# Altium footprint library MEBot.PcbLib: 161 footprints (part 7 of 11)
Each footprint in its own frame and in the unit in brackets; x right, y up, seen from the top. Pads: shape width x height; smd on the part's side, far side on the other; paste and mask are expansions set on the pad; w line width, h text height; cw(c..) or ccw(c..) is an arc to the next point about the centre after c.
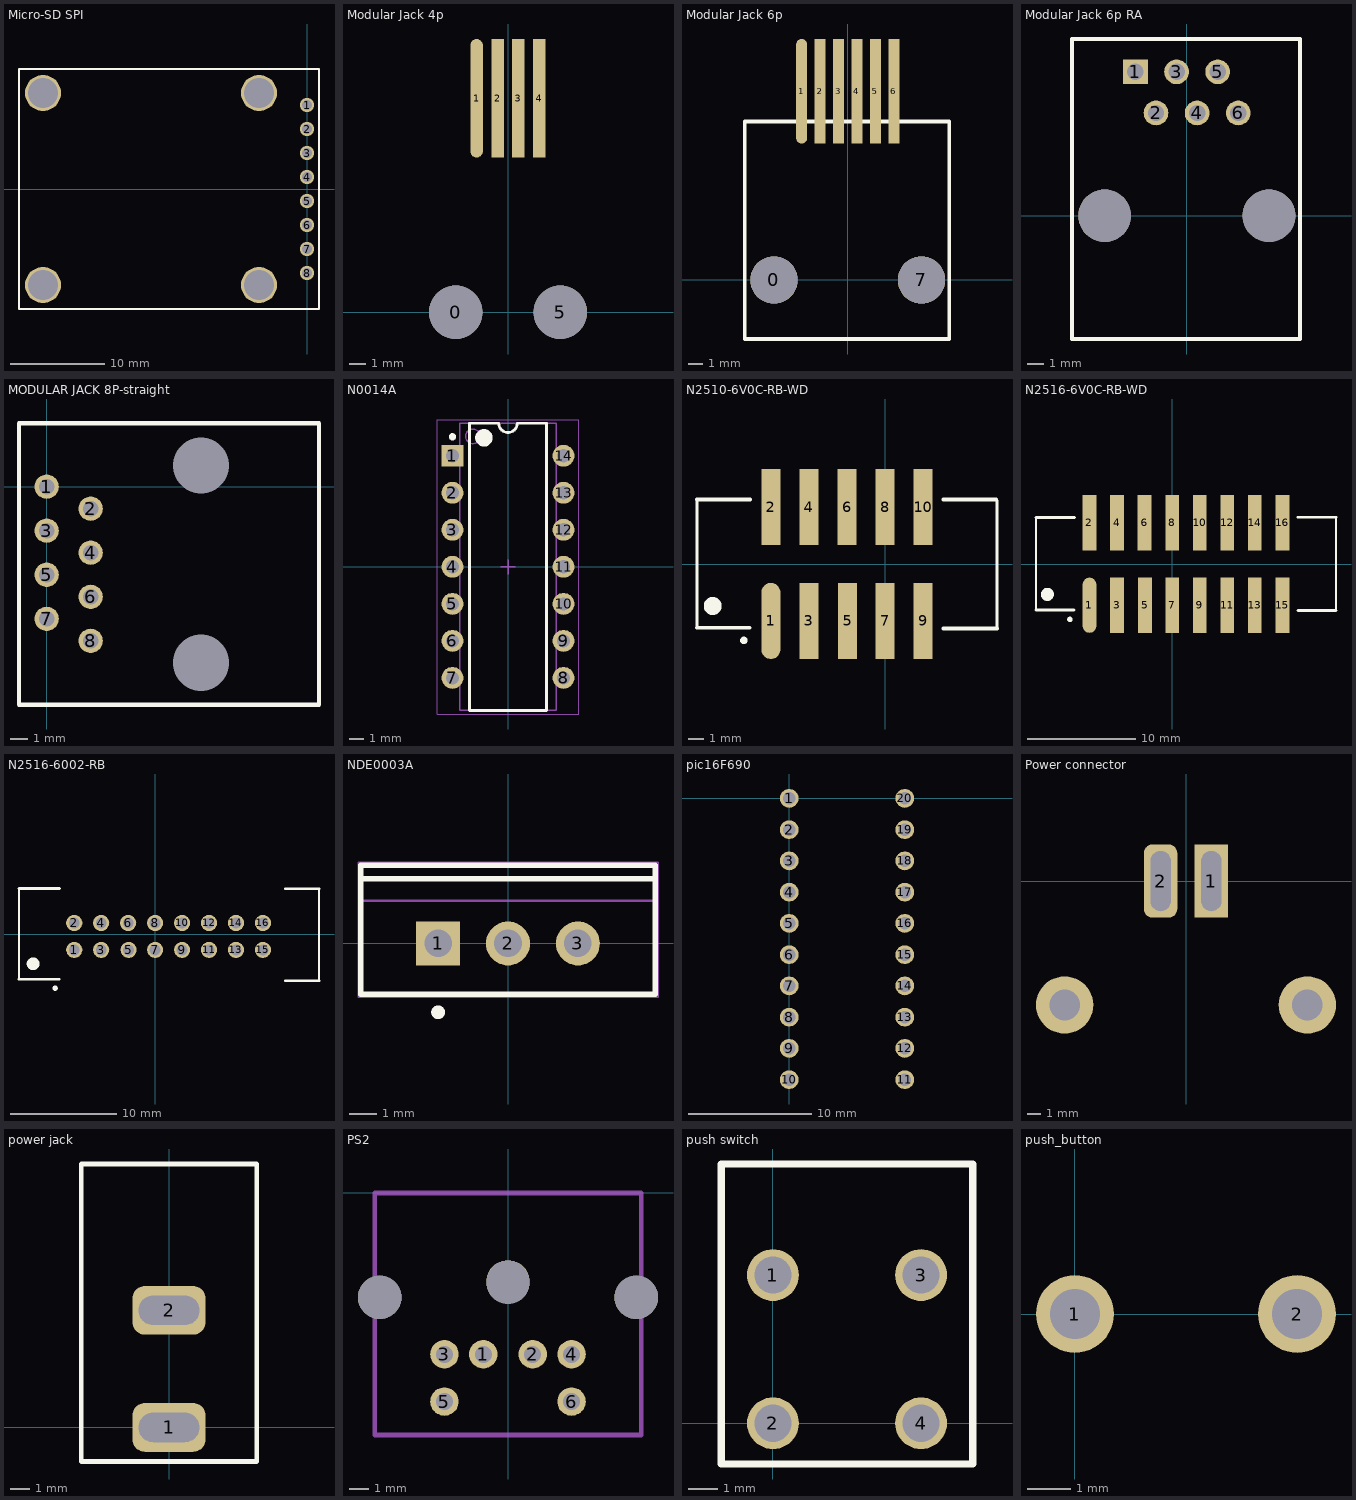
[diagram p6: the footprints below, top view; thin cyan lines are the x and y axes]

## Micro-SD SPI [mil]
pads (12):
  round 60 hole 40: 1(0,350) 2(0,250) 3(0,150) 4(0,50) 5(0,-50) 6(0,-150) 7(0,-250) 8(0,-350)
  round 150 hole 125: ""(-1100,-400) ""(-1100,400) ""(-200,-400) ""(-200,400)
Top Overlay:
  lines w10: -1200,-500 50,-500 50,500 -1200,500 -1200,-500

## Modular Jack 4p [mm] "Modular Ethernet Jack 4P"
pads (6):
  round 3.25 hole 3.25: 0(-3.18,0) 5(3.18,0)
  rrect100% 0.76x7.2 smd: 1(-1.905,13)
  rect 0.76x7.2 smd: 2(-0.635,13) 3(0.635,13) 4(1.905,13)

## Modular Jack 6p [mm] "Modular Ethernet Jack 6P"
height 16
pads (8):
  round 3.25 hole 3.25: 0(-5.08,0) 7(5.08,0)
  rrect100% 0.76x7.2 smd: 1(-3.175,13)
  rect 0.76x7.2 smd: 2(-1.905,13) 3(-0.635,13) 4(0.635,13) 5(1.905,13) 6(3.175,13)
Top Overlay:
  lines w0.254: -7.087,-4.064 -7.087,10.922 6.985,10.922 6.985,-4.064 -7.087,-4.064
3D body "955036671.stp": height 15.72, standoff -2.98, extent -6.63,-4.877 6.58,12.493

## Modular Jack 6p RA [mil] "Modular Ethernet Jack 6P Right Angle"
height 629.92
pads (8):
  rect 60x60 hole 40: 1(-125,350)
  round 60 hole 40: 2(-75,250) 3(-25,350) 4(25,250) 5(75,350) 6(125,250)
  round 127.95 hole 127.95: ""(-200,0) ""(200,0)
Top Overlay:
  lines w10: -279,-300 -279,430 275,430 275,-300 -279,-300
3D body "A-2014-1-4-N-T-R.step": height 644.88, standoff -143.7, extent -264.96,-255.91 264.96,393.7

## MODULAR JACK 8P-straight [mil] "MODULAR JACK 8P straight up"
pads (10):
  round 55 hole 35: 1(0,0) 2(100,-50) 3(0,-100) 4(100,-150) 5(0,-200) 6(100,-250) 7(0,-300) 8(100,-350)
  round 120 hole 127.95 unplated: ""(350.39,-400) ""(350.39,48)
Top Overlay:
  lines w10: -62.74,-495 -62.74,143.8 618.26,143.8 618.26,-495 -62.74,-495
3D body "91139088lf.stp": height 104.56, standoff -655.51, extent -54.93,-489.19 614.75,136.79

## N0014A [mm] "DIP, 14-Leads, Body 19.7x6.6mm, Pitch 2.54mm"
height 5.08
pads (14):
  rect 1.5x1.5 hole 0.9: 1(-3.81,7.62)
  round 1.5 hole 0.9: 2(-3.81,5.08) 3(-3.81,2.54) 4(-3.81,0) 5(-3.81,-2.54) 6(-3.81,-5.08) 7(-3.81,-7.62) 8(3.81,-7.62) 9(3.81,-5.08) 10(3.81,-2.54) 11(3.81,0) 12(3.81,2.54) 13(3.81,5.08) 14(3.81,7.62)
Top Overlay:
  circle w0.25: c-3.81,8.92 r0.125
  circle w0.6: c-1.65,8.85 r0.3
  lines w0.2: -2.65,-9.85 -2.65,9.85 -0.635,9.85 ccw(c0,9.85) 0.635,9.85 2.65,9.85 2.65,-9.85 -2.65,-9.85
Mechanical 1:
  text ".Designator" at -3.048,-0.508 h1.2
Mechanical 13:
  circle w0.1: c-2.4,8.95 r0.5
  lines w0.1: -3.3,-9.85 -3.3,9.85 3.3,9.85 3.3,-9.85 -3.3,-9.85
Mechanical 15:
  lines w0.05: -4.85,-10.1 -4.85,10.1 4.85,10.1 4.85,-10.1 -4.85,-10.1
  lines w0.1: -0.5,0 0.5,0 ; 0,-0.5 0,0.5
3D body: height 5.08, standoff 0.51, extent -3.3,-9.85 3.3,9.85
3D body: height 2.66, standoff 0, extent -3.945,7.12 -3.675,8.12
3D body: height 2.93, standoff 2.66, extent -3.945,7.12 -3.3,8.12
3D body: height 0, standoff -1.6, extent -3.945,7.26 -3.675,7.98
3D body: height 2.66, standoff 0, extent -3.945,4.58 -3.675,5.58
3D body: height 2.93, standoff 2.66, extent -3.945,4.58 -3.3,5.58
3D body: height 0, standoff -1.6, extent -3.945,4.72 -3.675,5.44
3D body: height 2.66, standoff 0, extent -3.945,2.04 -3.675,3.04
3D body: height 2.93, standoff 2.66, extent -3.945,2.04 -3.3,3.04
3D body: height 0, standoff -1.6, extent -3.945,2.18 -3.675,2.9
3D body: height 2.66, standoff 0, extent -3.945,-0.5 -3.675,0.5
3D body: height 2.93, standoff 2.66, extent -3.945,-0.5 -3.3,0.5
3D body: height 0, standoff -1.6, extent -3.945,-0.36 -3.675,0.36
3D body: height 2.66, standoff 0, extent -3.945,-3.04 -3.675,-2.04
3D body: height 2.93, standoff 2.66, extent -3.945,-3.04 -3.3,-2.04
3D body: height 0, standoff -1.6, extent -3.945,-2.9 -3.675,-2.18
3D body: height 2.66, standoff 0, extent -3.945,-5.58 -3.675,-4.58
3D body: height 2.93, standoff 2.66, extent -3.945,-5.58 -3.3,-4.58
3D body: height 0, standoff -1.6, extent -3.945,-5.44 -3.675,-4.72
3D body: height 2.66, standoff 0, extent -3.945,-8.12 -3.675,-7.12
3D body: height 2.93, standoff 2.66, extent -3.945,-8.12 -3.3,-7.12
3D body: height 0, standoff -1.6, extent -3.945,-7.98 -3.675,-7.26
3D body: height 2.66, standoff 0, extent 3.675,-8.12 3.945,-7.12
3D body: height 2.93, standoff 2.66, extent 3.3,-8.12 3.945,-7.12
3D body: height 0, standoff -1.6, extent 3.675,-7.98 3.945,-7.26
3D body: height 2.66, standoff 0, extent 3.675,-5.58 3.945,-4.58
3D body: height 2.93, standoff 2.66, extent 3.3,-5.58 3.945,-4.58
3D body: height 0, standoff -1.6, extent 3.675,-5.44 3.945,-4.72
3D body: height 2.66, standoff 0, extent 3.675,-3.04 3.945,-2.04
3D body: height 2.93, standoff 2.66, extent 3.3,-3.04 3.945,-2.04
3D body: height 0, standoff -1.6, extent 3.675,-2.9 3.945,-2.18
3D body: height 2.66, standoff 0, extent 3.675,-0.5 3.945,0.5
3D body: height 2.93, standoff 2.66, extent 3.3,-0.5 3.945,0.5
3D body: height 0, standoff -1.6, extent 3.675,-0.36 3.945,0.36
3D body: height 2.66, standoff 0, extent 3.675,2.04 3.945,3.04
3D body: height 2.93, standoff 2.66, extent 3.3,2.04 3.945,3.04
3D body: height 0, standoff -1.6, extent 3.675,2.18 3.945,2.9
3D body: height 2.66, standoff 0, extent 3.675,4.58 3.945,5.58
3D body: height 2.93, standoff 2.66, extent 3.3,4.58 3.945,5.58
3D body: height 0, standoff -1.6, extent 3.675,4.72 3.945,5.44
3D body: height 2.66, standoff 0, extent 3.675,7.12 3.945,8.12
3D body: height 2.93, standoff 2.66, extent 3.3,7.12 3.945,8.12
3D body: height 0, standoff -1.6, extent 3.675,7.26 3.945,7.98

## N2510-6V0C-RB-WD [mm] "CONN HEADER SMD 10POS 2.54MM"
height 10
pads (10):
  rrect100% 1.27x5.08 smd: 1(-7.62,-3.8)
  rect 1.27x5.08 smd: 2(-7.62,3.8) 3(-5.08,-3.8) 4(-5.08,3.8) 5(-2.5,-3.8) 6(-2.54,3.8) 7(0,-3.8) 8(0,3.8) 9(2.54,-3.8) 10(2.54,3.8)
Top Overlay:
  circle w0.25: c-9.425,-5.1 r0.125
  circle w0.6: c-11.5,-2.8 r0.3
  lines w0.2: -12.55,-4.25 -12.55,4.295 ; 7.405,4.295 7.47,4.23 7.47,-4.295
  lines w0.254: -12.55,-4.25 -9.05,-4.25 ; -12.55,4.295 -9.005,4.295 ; 3.905,-4.295 7.47,-4.295 ; 3.905,4.295 7.405,4.295
3D body "2510-6V0C-XX_STEP.stp": height 10.41, standoff 0.25, extent -12.548,-5.588 7.468,5.588

## N2516-6V0C-RB-WD [mm] "CONN HEADER SMD 16POS 2.54MM"
height 10
pads (16):
  rrect100% 1.27x5.08 smd: 1(-7.62,-3.8)
  rect 1.27x5.08 smd: 2(-7.62,3.8) 3(-5.08,-3.8) 4(-5.08,3.8) 5(-2.5,-3.8) 6(-2.54,3.8) 7(0,-3.8) 8(0,3.8) 9(2.54,-3.8) 10(2.54,3.8) 11(5.08,-3.8) 12(5.08,3.8) 13(7.62,-3.8) 14(7.62,3.8) 15(10.16,-3.8) 16(10.16,3.8)
Top Overlay:
  circle w0.6: c-11.5,-2.8 r0.3
  circle w0.25: c-9.425,-5.1 r0.125
  lines w0.2: -12.55,-4.25 -12.55,4.295 ; 15.09,-4.295 15.09,4.23
  lines w0.254: -12.55,-4.25 -9.05,-4.25 ; -12.55,4.295 -9.005,4.295 ; 11.6,4.3 15.1,4.3 ; 11.605,-4.295 15.09,-4.295
3D body "HEADER16P-SMD.stp": height 10.16, standoff 0, extent -12.497,-5.461 15.138,5.715

## N2516-6002-RB [mil] "Connector Header Through Hole 16 position 0.100\" (2.54mm)"
height 393.7
pads (16):
  round 60 hole 40: 1(-300,-58.86) 2(-300,41.14) 3(-200,-58.86) 4(-200,41.14) 5(-98.43,-58.86) 6(-100,41.14) 7(0,-58.86) 8(0,41.14) 9(100,-58.86) 10(100,41.14) 11(200,-58.86) 12(200,41.14) 13(300,-58.86) 14(300,41.14) 15(400,-58.86) 16(400,41.14)
Top Overlay:
  circle w23.62: c-452.76,-110.24 r11.81
  circle w9.84: c-371.06,-200.79 r4.92
  lines w7.87: -505,-167.32 -505,169.09 ; 608,-173.23 608,167.58
  lines w10: -505,-167.32 -356.3,-167.32 ; -505,169.09 -354.53,169.09 ; 483,-173.23 608,-173.23 ; 483,167.58 608,167.58
3D body "User Library-shrouded_header.step": height 385, standoff -120, extent -497,-199 599,181

## NDE0003A [mm] "FM, 3-Leads, Body 10.7x4.7mm, Pitch 2.54mm"
height 19.4
pads (3):
  rect 1.6x1.6 hole 1: 1(-2.54,0)
  round 1.6 hole 1: 2(0,0) 3(2.54,0)
Top Overlay:
  circle w0.25: c-2.54,-2.5 r0.125
  lines w0.2: -5.35,2.35 5.35,2.35 ; -5.35,-1.85 5.35,-1.85 5.35,2.85 -5.35,2.85 -5.35,-1.85
Mechanical 1:
  text ".Designator" at -1.524,-0.508 h1.02
Mechanical 13:
  lines w0.1: -5.35,1.55 5.35,1.55 ; -5.35,-1.85 5.35,-1.85 5.35,2.85 -5.35,2.85 -5.35,-1.85
Mechanical 15:
  lines w0.05: -5.45,-1.95 -5.45,2.95 5.45,2.95 5.45,-1.95 -5.45,-1.95
  lines w0.1: -0.5,0 0.5,0 ; 0,-0.5 0,0.5
3D body: height 19.4, standoff 12.9, extent -5.349,1.551 5.349,2.849
3D body: height 12.9, standoff 4, extent -5.4,-1.9 5.4,2.9

## pic16F690 [mil]
pads (20):
  round 60 hole 40: 1(0,0) 2(0,-100) 3(0,-200) 4(0,-300) 5(0,-400) 6(0,-500) 7(0,-600) 8(0,-700) 9(0,-800) 10(0,-900) 11(370,-900) 12(370,-800) 13(370,-700) 14(370,-600) 15(370,-500) 16(370,-400) 17(370,-300) 18(370,-200) 19(370,-100) 20(370,0)

## Power connector [mm] "digikey: H122221-ND"
pads (4):
  rect 2.5x5.5 hole 1.5 slot 4.5 at 90 deg: 1(1.905,0)
  rrect50% 2.5x5.5 hole 1.5 slot 4.5 at 90 deg: 2(-1.905,0)
  round 4.3 hole 2.3: ""(-9.105,-9.3) ""(9.105,-9.3)
3D body "FX30B-2S-3.81DS.stp": height 11.52, standoff -2.78, extent -10.28,-14.478 10.28,2.122

## power jack [mil]
pads (2):
  rrect50% 150x100 hole 60 slot 125 at 0 deg: 1(0,0) 2(0,240)
Top Overlay:
  lines w10: -180,-70 180,-70 180,540 -180,540 -180,-70
3D body "CUI_DEVICES_PJ-037AH.step": height 443.23, standoff -123.7, extent -175.39,-30.43 175,540.43

## PS2 [mm]
height 13.25
pads (9):
  round 1.5 hole 0.89: 1(-1.3,-8.51) 2(1.3,-8.51) 3(-3.35,-8.51) 4(3.35,-8.51) 5(-3.35,-11) 6(3.35,-11)
  round 2.29 hole 2.29: ""(-6.76,-5.51) ""(0,-4.7) ""(6.76,-5.51)
Mechanical 1:
  lines w0.254: -7.02,-12.77 7.02,-12.77 7.02,0 -7.02,0 -7.02,-12.77
3D body "PS2.STEP": height 13.1, standoff 0, extent -7.024,-12.751 7.036,0.059
3D body: height 3.17, standoff 0, extent -3.796,-11.455 -2.91,-10.568
3D body: height 3.17, standoff 0, extent 2.899,-11.455 3.785,-10.568
3D body: height 3.17, standoff 0, extent 2.91,-8.966 3.796,-8.079
3D body: height 3.17, standoff 0, extent -1.749,-8.966 -0.864,-8.079
3D body: height 3.17, standoff 0, extent -3.796,-8.966 -2.91,-8.079
3D body: height 3.17, standoff 0, extent 0.842,-8.966 1.727,-8.079

## push switch [mil] "push switch R/A"
pads (4):
  round 70 hole 50: 1(0,200) 2(0,0) 3(200,200) 4(200,0)
Top Overlay:
  lines w10: -70,-55 270,-55 270,350 -70,350 -70,-55
3D body "switch.stp": height 242.44, standoff -126.06, extent -60,-25 260.08,879.33

## push_button [mil]
pads (2):
  round 70 hole 45: 1(0,0) 2(200,0)
3D body "push_button.STEP": height 630, standoff -90, extent -345,-345 345,345